# Altium footprint library CONN_HDR_1.27MM_ST_SMD.PcbLib: 118 footprints (part 6 of 8) (continued)
## HDRMINIS_M_1X28 [mm] "mini header (50mil pitch)" (continued)
3D body "BD021-02A-A1-0350-0200-0550-LB.stp": height 5.5, standoff 0, extent 5.08,-2.75 7.62,2.75
3D body "BD021-02A-A1-0350-0200-0550-LB.stp": height 5.5, standoff 0, extent 7.62,-2.75 10.16,2.75
3D body "BD021-02A-A1-0350-0200-0550-LB.stp": height 5.5, standoff 0, extent 10.16,-2.75 12.7,2.75
3D body "BD021-02A-A1-0350-0200-0550-LB.stp": height 5.5, standoff 0, extent 12.7,-2.75 15.24,2.75
3D body "BD021-02A-A1-0350-0200-0550-LB.stp": height 5.5, standoff 0, extent 15.24,-2.75 17.78,2.75

## HDRMINIS_M_1X29 [mm] "mini header (50mil pitch)"
pads (29):
  oval 0.8x3.2 smd mask+0.1: 1(-17.78,1.4) 2(-16.51,-1.4) 3(-15.24,1.4) 4(-13.97,-1.4) 5(-12.7,1.4) 6(-11.43,-1.4) 7(-10.16,1.4) 8(-8.89,-1.4) 9(-7.62,1.4) 10(-6.35,-1.4) 11(-5.08,1.4) 12(-3.81,-1.4) 13(-2.54,1.4) 14(-1.27,-1.4) 15(0,1.4) 16(1.27,-1.4) 17(2.54,1.4) 18(3.81,-1.4) 19(5.08,1.4) 20(6.35,-1.4) 21(7.62,1.4) 22(8.89,-1.4) 23(10.16,1.4) 24(11.43,-1.4) 25(12.7,1.4) 26(13.97,-1.4) 27(15.24,1.4) 28(16.51,-1.4) 29(17.78,1.4)
Top Overlay:
  circle w0.2: c-18.923,0 r0.2
  lines w0.2: -18.316,0.8 -18.415,0.635 -18.415,-0.635 -18.316,-0.8 -17.244,-0.8 -17.145,-0.635 -17.046,-0.8 ; -17.145,0.635 -17.046,0.8 -15.974,0.8 -15.875,0.635 -15.776,0.8 ; -15.974,-0.8 -15.875,-0.635 -15.776,-0.8 -14.704,-0.8 -14.605,-0.635 -14.506,-0.8 ; -14.704,0.8 -14.605,0.635 -14.506,0.8 -13.434,0.8 -13.335,0.635 -13.236,0.8 ; -13.434,-0.8 -13.335,-0.635 -13.236,-0.8 -12.164,-0.8 -12.065,-0.635 -11.966,-0.8 ; -12.164,0.8 -12.065,0.635 -11.966,0.8 -10.894,0.8 -10.795,0.635 -10.696,0.8 ; -10.894,-0.8 -10.795,-0.635 -10.696,-0.8 -9.624,-0.8 -9.525,-0.635 -9.426,-0.8 ; -9.624,0.8 -9.525,0.635 -9.426,0.8 -8.354,0.8 -8.255,0.635 -8.156,0.8 ; -8.354,-0.8 -8.255,-0.635 -8.156,-0.8 -7.084,-0.8 -6.985,-0.635 -6.886,-0.8 ; -7.084,0.8 -6.985,0.635 -6.886,0.8 -5.814,0.8 -5.715,0.635 -5.616,0.8 ; -5.814,-0.8 -5.715,-0.635 -5.616,-0.8 -4.544,-0.8 -4.445,-0.635 -4.346,-0.8 ; -4.544,0.8 -4.445,0.635 -4.346,0.8 -3.274,0.8 -3.175,0.635 -3.076,0.8 ; -3.274,-0.8 -3.175,-0.635 -3.076,-0.8 -2.004,-0.8 -1.905,-0.635 -1.806,-0.8 ; -2.004,0.8 -1.905,0.635 -1.806,0.8 -0.734,0.8 -0.635,0.635 -0.536,0.8 ; -0.734,-0.8 -0.635,-0.635 -0.536,-0.8 0.536,-0.8 0.635,-0.635 0.734,-0.8 ; 0.536,0.8 0.635,0.635 0.734,0.8 1.806,0.8 1.905,0.635 2.004,0.8 ; 1.806,-0.8 1.905,-0.635 2.004,-0.8 3.076,-0.8 3.175,-0.635 3.274,-0.8 ; 3.076,0.8 3.175,0.635 3.274,0.8 4.346,0.8 4.445,0.635 4.544,0.8 ; 4.346,-0.8 4.445,-0.635 4.544,-0.8 5.616,-0.8 5.715,-0.635 5.814,-0.8 ; 5.616,0.8 5.715,0.635 5.814,0.8 6.886,0.8 6.985,0.635 7.084,0.8 ; 6.886,-0.8 6.985,-0.635 7.084,-0.8 8.156,-0.8 8.255,-0.635 8.354,-0.8 ; 8.156,0.8 8.255,0.635 8.354,0.8 9.426,0.8 9.525,0.635 9.624,0.8 ; 9.426,-0.8 9.525,-0.635 9.624,-0.8 10.696,-0.8 10.795,-0.635 10.894,-0.8 ; 10.696,0.8 10.795,0.635 10.894,0.8 11.966,0.8 12.065,0.635 12.164,0.8 ; 11.966,-0.8 12.065,-0.635 12.164,-0.8 13.236,-0.8 13.335,-0.635 13.434,-0.8 ; 13.236,0.8 13.335,0.635 13.434,0.8 14.506,0.8 14.605,0.635 14.704,0.8 ; 14.506,-0.8 14.605,-0.635 14.704,-0.8 15.776,-0.8 15.875,-0.635 15.974,-0.8 ; 15.776,0.8 15.875,0.635 15.974,0.8 17.046,0.8 17.145,0.635 17.244,0.8 ; 17.046,-0.8 17.145,-0.635 17.244,-0.8 18.316,-0.8 18.415,-0.635 18.415,0.635 18.316,0.8
3D body "BD021-02A-A1-0350-0200-0550-LB.stp": height 5.5, standoff 0, extent 15.875,-2.75 18.415,2.75
3D body "BD021-02A-A1-0350-0200-0550-LB.stp": height 5.5, standoff 0, extent 13.335,-2.75 15.875,2.75
3D body "BD021-02A-A1-0350-0200-0550-LB.stp": height 5.5, standoff 0, extent 10.795,-2.75 13.335,2.75
3D body "BD021-02A-A1-0350-0200-0550-LB.stp": height 5.5, standoff 0, extent 8.255,-2.75 10.795,2.75
3D body "BD021-02A-A1-0350-0200-0550-LB.stp": height 5.5, standoff 0, extent 5.715,-2.75 8.255,2.75
3D body "BD021-02A-A1-0350-0200-0550-LB.stp": height 5.5, standoff 0, extent 3.175,-2.75 5.715,2.75
3D body "BD021-02A-A1-0350-0200-0550-LB.stp": height 5.5, standoff 0, extent 0.635,-2.75 3.175,2.75
3D body "BD021-02A-A1-0350-0200-0550-LB.stp": height 5.5, standoff 0, extent -1.905,-2.75 0.635,2.75
3D body "BD021-02A-A1-0350-0200-0550-LB.stp": height 5.5, standoff 0, extent -4.445,-2.75 -1.905,2.75
3D body "BD021-02A-A1-0350-0200-0550-LB.stp": height 5.5, standoff 0, extent -6.985,-2.75 -4.445,2.75
3D body "BD021-02A-A1-0350-0200-0550-LB.stp": height 5.5, standoff 0, extent -9.525,-2.75 -6.985,2.75
3D body "BD021-02A-A1-0350-0200-0550-LB.stp": height 5.5, standoff 0, extent -12.065,-2.75 -9.525,2.75
3D body "BD021-02A-A1-0350-0200-0550-LB.stp": height 5.5, standoff 0, extent -14.605,-2.75 -12.065,2.75
3D body "BD021-03A-A1-0350-0200-0550-LB.stp": height 5.5, standoff 0, extent -18.42,-2.75 -14.61,2.75

## HDRMINIS_M_1X30 [mm] "mini header (50mil pitch)"
pads (30):
  oval 0.8x3.2 smd mask+0.1: 1(-18.415,-1.4) 2(-17.145,1.4) 3(-15.875,-1.4) 4(-14.605,1.4) 5(-13.335,-1.4) 6(-12.065,1.4) 7(-10.795,-1.4) 8(-9.525,1.4) 9(-8.255,-1.4) 10(-6.985,1.4) 11(-5.715,-1.4) 12(-4.445,1.4) 13(-3.175,-1.4) 14(-1.905,1.4) 15(-0.635,-1.4) 16(0.635,1.4) 17(1.905,-1.4) 18(3.175,1.4) 19(4.445,-1.4) 20(5.715,1.4) 21(6.985,-1.4) 22(8.255,1.4) 23(9.525,-1.4) 24(10.795,1.4) 25(12.065,-1.4) 26(13.335,1.4) 27(14.605,-1.4) 28(15.875,1.4) 29(17.145,-1.4) 30(18.415,1.4)
Top Overlay:
  drawing of 153 lines, arcs and shapes, not listed
3D body "BD021-02A-A1-0350-0200-0550-LB.stp": height 5.5, standoff 0, extent -19.05,-2.75 -16.51,2.75
3D body "BD021-02A-A1-0350-0200-0550-LB.stp": height 5.5, standoff 0, extent -16.51,-2.75 -13.97,2.75
3D body "BD021-02A-A1-0350-0200-0550-LB.stp": height 5.5, standoff 0, extent -13.97,-2.75 -11.43,2.75
3D body "BD021-02A-A1-0350-0200-0550-LB.stp": height 5.5, standoff 0, extent -11.43,-2.75 -8.89,2.75
3D body "BD021-02A-A1-0350-0200-0550-LB.stp": height 5.5, standoff 0, extent -8.89,-2.75 -6.35,2.75
3D body "BD021-02A-A1-0350-0200-0550-LB.stp": height 5.5, standoff 0, extent -6.35,-2.75 -3.81,2.75
3D body "BD021-02A-A1-0350-0200-0550-LB.stp": height 5.5, standoff 0, extent -3.81,-2.75 -1.27,2.75
3D body "BD021-02A-A1-0350-0200-0550-LB.stp": height 5.5, standoff 0, extent -1.27,-2.75 1.27,2.75
3D body "BD021-02A-A1-0350-0200-0550-LB.stp": height 5.5, standoff 0, extent 1.27,-2.75 3.81,2.75
3D body "BD021-02A-A1-0350-0200-0550-LB.stp": height 5.5, standoff 0, extent 3.81,-2.75 6.35,2.75
3D body "BD021-02A-A1-0350-0200-0550-LB.stp": height 5.5, standoff 0, extent 6.35,-2.75 8.89,2.75
3D body "BD021-02A-A1-0350-0200-0550-LB.stp": height 5.5, standoff 0, extent 8.89,-2.75 11.43,2.75
3D body "BD021-02A-A1-0350-0200-0550-LB.stp": height 5.5, standoff 0, extent 11.43,-2.75 13.97,2.75
3D body "BD021-02A-A1-0350-0200-0550-LB.stp": height 5.5, standoff 0, extent 13.97,-2.75 16.51,2.75
3D body "BD021-02A-A1-0350-0200-0550-LB.stp": height 5.5, standoff 0, extent 16.51,-2.75 19.05,2.75

## HDRMINIS_M_1X31 [mm] "mini header (50mil pitch)"
pads (31):
  oval 0.8x3.2 smd mask+0.1: 1(-19.05,1.4) 2(-17.78,-1.4) 3(-16.51,1.4) 4(-15.24,-1.4) 5(-13.97,1.4) 6(-12.7,-1.4) 7(-11.43,1.4) 8(-10.16,-1.4) 9(-8.89,1.4) 10(-7.62,-1.4) 11(-6.35,1.4) 12(-5.08,-1.4) 13(-3.81,1.4) 14(-2.54,-1.4) 15(-1.27,1.4) 16(0,-1.4) 17(1.27,1.4) 18(2.54,-1.4) 19(3.81,1.4) 20(5.08,-1.4) 21(6.35,1.4) 22(7.62,-1.4) 23(8.89,1.4) 24(10.16,-1.4) 25(11.43,1.4) 26(12.7,-1.4) 27(13.97,1.4) 28(15.24,-1.4) 29(16.51,1.4) 30(17.78,-1.4) 31(19.05,1.4)
Top Overlay:
  drawing of 157 lines, arcs and shapes, not listed
3D body "BD021-03A-A1-0350-0200-0550-LB.stp": height 5.5, standoff 0, extent -19.69,-2.75 -15.88,2.75
3D body "BD021-02A-A1-0350-0200-0550-LB.stp": height 5.5, standoff 0, extent -15.875,-2.75 -13.335,2.75
3D body "BD021-02A-A1-0350-0200-0550-LB.stp": height 5.5, standoff 0, extent -13.335,-2.75 -10.795,2.75
3D body "BD021-02A-A1-0350-0200-0550-LB.stp": height 5.5, standoff 0, extent -10.795,-2.75 -8.255,2.75
3D body "BD021-02A-A1-0350-0200-0550-LB.stp": height 5.5, standoff 0, extent -8.255,-2.75 -5.715,2.75
3D body "BD021-02A-A1-0350-0200-0550-LB.stp": height 5.5, standoff 0, extent -5.715,-2.75 -3.175,2.75
3D body "BD021-02A-A1-0350-0200-0550-LB.stp": height 5.5, standoff 0, extent -3.175,-2.75 -0.635,2.75
3D body "BD021-02A-A1-0350-0200-0550-LB.stp": height 5.5, standoff 0, extent -0.635,-2.75 1.905,2.75
3D body "BD021-02A-A1-0350-0200-0550-LB.stp": height 5.5, standoff 0, extent 1.905,-2.75 4.445,2.75
3D body "BD021-02A-A1-0350-0200-0550-LB.stp": height 5.5, standoff 0, extent 4.445,-2.75 6.985,2.75
3D body "BD021-02A-A1-0350-0200-0550-LB.stp": height 5.5, standoff 0, extent 6.985,-2.75 9.525,2.75
3D body "BD021-02A-A1-0350-0200-0550-LB.stp": height 5.5, standoff 0, extent 9.525,-2.75 12.065,2.75
3D body "BD021-02A-A1-0350-0200-0550-LB.stp": height 5.5, standoff 0, extent 12.065,-2.75 14.605,2.75
3D body "BD021-02A-A1-0350-0200-0550-LB.stp": height 5.5, standoff 0, extent 14.605,-2.75 17.145,2.75
3D body "BD021-02A-A1-0350-0200-0550-LB.stp": height 5.5, standoff 0, extent 17.145,-2.75 19.685,2.75

## HDRMINIS_M_1X32 [mm] "mini header (50mil pitch)"
pads (32):
  oval 0.8x3.2 smd mask+0.1: 1(-19.685,-1.4) 2(-18.415,1.4) 3(-17.145,-1.4) 4(-15.875,1.4) 5(-14.605,-1.4) 6(-13.335,1.4) 7(-12.065,-1.4) 8(-10.795,1.4) 9(-9.525,-1.4) 10(-8.255,1.4) 11(-6.985,-1.4) 12(-5.715,1.4) 13(-4.445,-1.4) 14(-3.175,1.4) 15(-1.905,-1.4) 16(-0.635,1.4) 17(0.635,-1.4) 18(1.905,1.4) 19(3.175,-1.4) 20(4.445,1.4) 21(5.715,-1.4) 22(6.985,1.4) 23(8.255,-1.4) 24(9.525,1.4) 25(10.795,-1.4) 26(12.065,1.4) 27(13.335,-1.4) 28(14.605,1.4) 29(15.875,-1.4) 30(17.145,1.4) 31(18.415,-1.4) 32(19.685,1.4)
Top Overlay:
  drawing of 163 lines, arcs and shapes, not listed
3D body "BD021-02A-A1-0350-0200-0550-LB.stp": height 5.5, standoff 0, extent -20.32,-2.75 -17.78,2.75
3D body "BD021-02A-A1-0350-0200-0550-LB.stp": height 5.5, standoff 0, extent -17.78,-2.75 -15.24,2.75
3D body "BD021-02A-A1-0350-0200-0550-LB.stp": height 5.5, standoff 0, extent -15.24,-2.75 -12.7,2.75
3D body "BD021-02A-A1-0350-0200-0550-LB.stp": height 5.5, standoff 0, extent -12.7,-2.75 -10.16,2.75
3D body "BD021-02A-A1-0350-0200-0550-LB.stp": height 5.5, standoff 0, extent -10.16,-2.75 -7.62,2.75
3D body "BD021-02A-A1-0350-0200-0550-LB.stp": height 5.5, standoff 0, extent -7.62,-2.75 -5.08,2.75
3D body "BD021-02A-A1-0350-0200-0550-LB.stp": height 5.5, standoff 0, extent -5.08,-2.75 -2.54,2.75
3D body "BD021-02A-A1-0350-0200-0550-LB.stp": height 5.5, standoff 0, extent -2.54,-2.75 0,2.75
3D body "BD021-02A-A1-0350-0200-0550-LB.stp": height 5.5, standoff 0, extent 0,-2.75 2.54,2.75
3D body "BD021-02A-A1-0350-0200-0550-LB.stp": height 5.5, standoff 0, extent 2.54,-2.75 5.08,2.75
3D body "BD021-02A-A1-0350-0200-0550-LB.stp": height 5.5, standoff 0, extent 5.08,-2.75 7.62,2.75
3D body "BD021-02A-A1-0350-0200-0550-LB.stp": height 5.5, standoff 0, extent 7.62,-2.75 10.16,2.75
3D body "BD021-02A-A1-0350-0200-0550-LB.stp": height 5.5, standoff 0, extent 10.16,-2.75 12.7,2.75
3D body "BD021-02A-A1-0350-0200-0550-LB.stp": height 5.5, standoff 0, extent 12.7,-2.75 15.24,2.75
3D body "BD021-02A-A1-0350-0200-0550-LB.stp": height 5.5, standoff 0, extent 15.24,-2.75 17.78,2.75
3D body "BD021-02A-A1-0350-0200-0550-LB.stp": height 5.5, standoff 0, extent 17.78,-2.75 20.32,2.75

## HDRMINIS_M_1X33 [mm] "mini header (50mil pitch)"
pads (33):
  oval 0.8x3.2 smd mask+0.1: 1(-20.32,1.4) 2(-19.05,-1.4) 3(-17.78,1.4) 4(-16.51,-1.4) 5(-15.24,1.4) 6(-13.97,-1.4) 7(-12.7,1.4) 8(-11.43,-1.4) 9(-10.16,1.4) 10(-8.89,-1.4) 11(-7.62,1.4) 12(-6.35,-1.4) 13(-5.08,1.4) 14(-3.81,-1.4) 15(-2.54,1.4) 16(-1.27,-1.4) 17(0,1.4) 18(1.27,-1.4) 19(2.54,1.4) 20(3.81,-1.4) 21(5.08,1.4) 22(6.35,-1.4) 23(7.62,1.4) 24(8.89,-1.4) 25(10.16,1.4) 26(11.43,-1.4) 27(12.7,1.4) 28(13.97,-1.4) 29(15.24,1.4) 30(16.51,-1.4) 31(17.78,1.4) 32(19.05,-1.4) 33(20.32,1.4)
Top Overlay:
  drawing of 167 lines, arcs and shapes, not listed
3D body "BD021-03A-A1-0350-0200-0550-LB.stp": height 5.5, standoff 0, extent -20.96,-2.75 -17.15,2.75
3D body "BD021-02A-A1-0350-0200-0550-LB.stp": height 5.5, standoff 0, extent -17.145,-2.75 -14.605,2.75
3D body "BD021-02A-A1-0350-0200-0550-LB.stp": height 5.5, standoff 0, extent -14.605,-2.75 -12.065,2.75
3D body "BD021-02A-A1-0350-0200-0550-LB.stp": height 5.5, standoff 0, extent -12.065,-2.75 -9.525,2.75
3D body "BD021-02A-A1-0350-0200-0550-LB.stp": height 5.5, standoff 0, extent -9.525,-2.75 -6.985,2.75
3D body "BD021-02A-A1-0350-0200-0550-LB.stp": height 5.5, standoff 0, extent -6.985,-2.75 -4.445,2.75
3D body "BD021-02A-A1-0350-0200-0550-LB.stp": height 5.5, standoff 0, extent -4.445,-2.75 -1.905,2.75
3D body "BD021-02A-A1-0350-0200-0550-LB.stp": height 5.5, standoff 0, extent -1.905,-2.75 0.635,2.75
3D body "BD021-02A-A1-0350-0200-0550-LB.stp": height 5.5, standoff 0, extent 0.635,-2.75 3.175,2.75
3D body "BD021-02A-A1-0350-0200-0550-LB.stp": height 5.5, standoff 0, extent 3.175,-2.75 5.715,2.75
3D body "BD021-02A-A1-0350-0200-0550-LB.stp": height 5.5, standoff 0, extent 5.715,-2.75 8.255,2.75
3D body "BD021-02A-A1-0350-0200-0550-LB.stp": height 5.5, standoff 0, extent 8.255,-2.75 10.795,2.75
3D body "BD021-02A-A1-0350-0200-0550-LB.stp": height 5.5, standoff 0, extent 10.795,-2.75 13.335,2.75
3D body "BD021-02A-A1-0350-0200-0550-LB.stp": height 5.5, standoff 0, extent 13.335,-2.75 15.875,2.75
3D body "BD021-02A-A1-0350-0200-0550-LB.stp": height 5.5, standoff 0, extent 15.875,-2.75 18.415,2.75
3D body "BD021-02A-A1-0350-0200-0550-LB.stp": height 5.5, standoff 0, extent 18.415,-2.75 20.955,2.75

## HDRMINIS_M_1X34 [mm] "mini header (50mil pitch)"
pads (34):
  oval 0.8x3.2 smd mask+0.1: 1(-20.955,-1.4) 2(-19.685,1.4) 3(-18.415,-1.4) 4(-17.145,1.4) 5(-15.875,-1.4) 6(-14.605,1.4) 7(-13.335,-1.4) 8(-12.065,1.4) 9(-10.795,-1.4) 10(-9.525,1.4) 11(-8.255,-1.4) 12(-6.985,1.4) 13(-5.715,-1.4) 14(-4.445,1.4) 15(-3.175,-1.4) 16(-1.905,1.4) 17(-0.635,-1.4) 18(0.635,1.4) 19(1.905,-1.4) 20(3.175,1.4) 21(4.445,-1.4) 22(5.715,1.4) 23(6.985,-1.4) 24(8.255,1.4) 25(9.525,-1.4) 26(10.795,1.4) 27(12.065,-1.4) 28(13.335,1.4) 29(14.605,-1.4) 30(15.875,1.4) 31(17.145,-1.4) 32(18.415,1.4) 33(19.685,-1.4) 34(20.955,1.4)
Top Overlay:
  drawing of 173 lines, arcs and shapes, not listed
3D body "BD021-02A-A1-0350-0200-0550-LB.stp": height 5.5, standoff 0, extent 19.05,-2.75 21.59,2.75
3D body "BD021-02A-A1-0350-0200-0550-LB.stp": height 5.5, standoff 0, extent 16.51,-2.75 19.05,2.75
3D body "BD021-02A-A1-0350-0200-0550-LB.stp": height 5.5, standoff 0, extent 13.97,-2.75 16.51,2.75
3D body "BD021-02A-A1-0350-0200-0550-LB.stp": height 5.5, standoff 0, extent 11.43,-2.75 13.97,2.75
3D body "BD021-02A-A1-0350-0200-0550-LB.stp": height 5.5, standoff 0, extent 8.89,-2.75 11.43,2.75
3D body "BD021-02A-A1-0350-0200-0550-LB.stp": height 5.5, standoff 0, extent 6.35,-2.75 8.89,2.75
3D body "BD021-02A-A1-0350-0200-0550-LB.stp": height 5.5, standoff 0, extent 3.81,-2.75 6.35,2.75
3D body "BD021-02A-A1-0350-0200-0550-LB.stp": height 5.5, standoff 0, extent 1.27,-2.75 3.81,2.75
3D body "BD021-02A-A1-0350-0200-0550-LB.stp": height 5.5, standoff 0, extent -1.27,-2.75 1.27,2.75
3D body "BD021-02A-A1-0350-0200-0550-LB.stp": height 5.5, standoff 0, extent -3.81,-2.75 -1.27,2.75
3D body "BD021-02A-A1-0350-0200-0550-LB.stp": height 5.5, standoff 0, extent -6.35,-2.75 -3.81,2.75
3D body "BD021-02A-A1-0350-0200-0550-LB.stp": height 5.5, standoff 0, extent -8.89,-2.75 -6.35,2.75
3D body "BD021-02A-A1-0350-0200-0550-LB.stp": height 5.5, standoff 0, extent -11.43,-2.75 -8.89,2.75
3D body "BD021-02A-A1-0350-0200-0550-LB.stp": height 5.5, standoff 0, extent -13.97,-2.75 -11.43,2.75
3D body "BD021-02A-A1-0350-0200-0550-LB.stp": height 5.5, standoff 0, extent -16.51,-2.75 -13.97,2.75
3D body "BD021-02A-A1-0350-0200-0550-LB.stp": height 5.5, standoff 0, extent -19.05,-2.75 -16.51,2.75
3D body "BD021-02A-A1-0350-0200-0550-LB.stp": height 5.5, standoff 0, extent -21.59,-2.75 -19.05,2.75

## HDRMINIS_M_1X35 [mm] "mini header (50mil pitch)"
pads (35):
  oval 0.8x3.2 smd mask+0.1: 1(-21.59,1.4) 2(-20.32,-1.4) 3(-19.05,1.4) 4(-17.78,-1.4) 5(-16.51,1.4) 6(-15.24,-1.4) 7(-13.97,1.4) 8(-12.7,-1.4) 9(-11.43,1.4) 10(-10.16,-1.4) 11(-8.89,1.4) 12(-7.62,-1.4) 13(-6.35,1.4) 14(-5.08,-1.4) 15(-3.81,1.4) 16(-2.54,-1.4) 17(-1.27,1.4) 18(0,-1.4) 19(1.27,1.4) 20(2.54,-1.4) 21(3.81,1.4) 22(5.08,-1.4) 23(6.35,1.4) 24(7.62,-1.4) 25(8.89,1.4) 26(10.16,-1.4) 27(11.43,1.4) 28(12.7,-1.4) 29(13.97,1.4) 30(15.24,-1.4) 31(16.51,1.4) 32(17.78,-1.4) 33(19.05,1.4) 34(20.32,-1.4) 35(21.59,1.4)
Top Overlay:
  drawing of 177 lines, arcs and shapes, not listed
3D body "BD021-02A-A1-0350-0200-0550-LB.stp": height 5.5, standoff 0, extent 19.685,-2.75 22.225,2.75
3D body "BD021-02A-A1-0350-0200-0550-LB.stp": height 5.5, standoff 0, extent 17.145,-2.75 19.685,2.75
3D body "BD021-02A-A1-0350-0200-0550-LB.stp": height 5.5, standoff 0, extent 14.605,-2.75 17.145,2.75
3D body "BD021-02A-A1-0350-0200-0550-LB.stp": height 5.5, standoff 0, extent 12.065,-2.75 14.605,2.75
3D body "BD021-02A-A1-0350-0200-0550-LB.stp": height 5.5, standoff 0, extent 9.525,-2.75 12.065,2.75
3D body "BD021-02A-A1-0350-0200-0550-LB.stp": height 5.5, standoff 0, extent 6.985,-2.75 9.525,2.75
3D body "BD021-02A-A1-0350-0200-0550-LB.stp": height 5.5, standoff 0, extent 4.445,-2.75 6.985,2.75
3D body "BD021-02A-A1-0350-0200-0550-LB.stp": height 5.5, standoff 0, extent 1.905,-2.75 4.445,2.75
3D body "BD021-02A-A1-0350-0200-0550-LB.stp": height 5.5, standoff 0, extent -0.635,-2.75 1.905,2.75
3D body "BD021-02A-A1-0350-0200-0550-LB.stp": height 5.5, standoff 0, extent -3.175,-2.75 -0.635,2.75
3D body "BD021-02A-A1-0350-0200-0550-LB.stp": height 5.5, standoff 0, extent -5.715,-2.75 -3.175,2.75
3D body "BD021-02A-A1-0350-0200-0550-LB.stp": height 5.5, standoff 0, extent -8.255,-2.75 -5.715,2.75
3D body "BD021-02A-A1-0350-0200-0550-LB.stp": height 5.5, standoff 0, extent -10.795,-2.75 -8.255,2.75
3D body "BD021-02A-A1-0350-0200-0550-LB.stp": height 5.5, standoff 0, extent -13.335,-2.75 -10.795,2.75
3D body "BD021-02A-A1-0350-0200-0550-LB.stp": height 5.5, standoff 0, extent -15.875,-2.75 -13.335,2.75
3D body "BD021-02A-A1-0350-0200-0550-LB.stp": height 5.5, standoff 0, extent -18.415,-2.75 -15.875,2.75
3D body "BD021-03A-A1-0350-0200-0550-LB.stp": height 5.5, standoff 0, extent -22.23,-2.75 -18.42,2.75

## HDRMINIS_M_1X36 [mm] "mini header (50mil pitch)"
pads (36):
  oval 0.8x3.2 smd mask+0.1: 1(-22.225,-1.4) 2(-20.955,1.4) 3(-19.685,-1.4) 4(-18.415,1.4) 5(-17.145,-1.4) 6(-15.875,1.4) 7(-14.605,-1.4) 8(-13.335,1.4) 9(-12.065,-1.4) 10(-10.795,1.4) 11(-9.525,-1.4) 12(-8.255,1.4) 13(-6.985,-1.4) 14(-5.715,1.4) 15(-4.445,-1.4) 16(-3.175,1.4) 17(-1.905,-1.4) 18(-0.635,1.4) 19(0.635,-1.4) 20(1.905,1.4) 21(3.175,-1.4) 22(4.445,1.4) 23(5.715,-1.4) 24(6.985,1.4) 25(8.255,-1.4) 26(9.525,1.4) 27(10.795,-1.4) 28(12.065,1.4) 29(13.335,-1.4) 30(14.605,1.4) 31(15.875,-1.4) 32(17.145,1.4) 33(18.415,-1.4) 34(19.685,1.4) 35(20.955,-1.4) 36(22.225,1.4)
Top Overlay:
  drawing of 183 lines, arcs and shapes, not listed
3D body "BD021-02A-A1-0350-0200-0550-LB.stp": height 5.5, standoff 0, extent -22.86,-2.75 -20.32,2.75
3D body "BD021-02A-A1-0350-0200-0550-LB.stp": height 5.5, standoff 0, extent -20.32,-2.75 -17.78,2.75
3D body "BD021-02A-A1-0350-0200-0550-LB.stp": height 5.5, standoff 0, extent -17.78,-2.75 -15.24,2.75
3D body "BD021-02A-A1-0350-0200-0550-LB.stp": height 5.5, standoff 0, extent -15.24,-2.75 -12.7,2.75
3D body "BD021-02A-A1-0350-0200-0550-LB.stp": height 5.5, standoff 0, extent -12.7,-2.75 -10.16,2.75
3D body "BD021-02A-A1-0350-0200-0550-LB.stp": height 5.5, standoff 0, extent -10.16,-2.75 -7.62,2.75
3D body "BD021-02A-A1-0350-0200-0550-LB.stp": height 5.5, standoff 0, extent -7.62,-2.75 -5.08,2.75
3D body "BD021-02A-A1-0350-0200-0550-LB.stp": height 5.5, standoff 0, extent -5.08,-2.75 -2.54,2.75
3D body "BD021-02A-A1-0350-0200-0550-LB.stp": height 5.5, standoff 0, extent -2.54,-2.75 0,2.75
3D body "BD021-02A-A1-0350-0200-0550-LB.stp": height 5.5, standoff 0, extent 0,-2.75 2.54,2.75
3D body "BD021-02A-A1-0350-0200-0550-LB.stp": height 5.5, standoff 0, extent 2.54,-2.75 5.08,2.75
3D body "BD021-02A-A1-0350-0200-0550-LB.stp": height 5.5, standoff 0, extent 5.08,-2.75 7.62,2.75
3D body "BD021-02A-A1-0350-0200-0550-LB.stp": height 5.5, standoff 0, extent 7.62,-2.75 10.16,2.75
3D body "BD021-02A-A1-0350-0200-0550-LB.stp": height 5.5, standoff 0, extent 10.16,-2.75 12.7,2.75
3D body "BD021-02A-A1-0350-0200-0550-LB.stp": height 5.5, standoff 0, extent 12.7,-2.75 15.24,2.75
3D body "BD021-02A-A1-0350-0200-0550-LB.stp": height 5.5, standoff 0, extent 15.24,-2.75 17.78,2.75
3D body "BD021-02A-A1-0350-0200-0550-LB.stp": height 5.5, standoff 0, extent 17.78,-2.75 20.32,2.75
3D body "BD021-02A-A1-0350-0200-0550-LB.stp": height 5.5, standoff 0, extent 20.32,-2.75 22.86,2.75

## HDRMINIS_M_1X37 [mm] "mini header (50mil pitch)"
pads (37):
  oval 0.8x3.2 smd mask+0.1: 1(-22.86,1.4) 2(-21.59,-1.4) 3(-20.32,1.4) 4(-19.05,-1.4) 5(-17.78,1.4) 6(-16.51,-1.4) 7(-15.24,1.4) 8(-13.97,-1.4) 9(-12.7,1.4) 10(-11.43,-1.4) 11(-10.16,1.4) 12(-8.89,-1.4) 13(-7.62,1.4) 14(-6.35,-1.4) 15(-5.08,1.4) 16(-3.81,-1.4) 17(-2.54,1.4) 18(-1.27,-1.4) 19(0,1.4) 20(1.27,-1.4) 21(2.54,1.4) 22(3.81,-1.4) 23(5.08,1.4) 24(6.35,-1.4) 25(7.62,1.4) 26(8.89,-1.4) 27(10.16,1.4) 28(11.43,-1.4) 29(12.7,1.4) 30(13.97,-1.4) 31(15.24,1.4) 32(16.51,-1.4) 33(17.78,1.4) 34(19.05,-1.4) 35(20.32,1.4) 36(21.59,-1.4) 37(22.86,1.4)
Top Overlay:
  drawing of 187 lines, arcs and shapes, not listed
3D body "BD021-02A-A1-0350-0200-0550-LB.stp": height 5.5, standoff 0, extent 20.955,-2.75 23.495,2.75
3D body "BD021-02A-A1-0350-0200-0550-LB.stp": height 5.5, standoff 0, extent 18.415,-2.75 20.955,2.75
3D body "BD021-02A-A1-0350-0200-0550-LB.stp": height 5.5, standoff 0, extent 15.875,-2.75 18.415,2.75
3D body "BD021-02A-A1-0350-0200-0550-LB.stp": height 5.5, standoff 0, extent 13.335,-2.75 15.875,2.75
3D body "BD021-02A-A1-0350-0200-0550-LB.stp": height 5.5, standoff 0, extent 10.795,-2.75 13.335,2.75
3D body "BD021-02A-A1-0350-0200-0550-LB.stp": height 5.5, standoff 0, extent 8.255,-2.75 10.795,2.75
3D body "BD021-02A-A1-0350-0200-0550-LB.stp": height 5.5, standoff 0, extent 5.715,-2.75 8.255,2.75
3D body "BD021-02A-A1-0350-0200-0550-LB.stp": height 5.5, standoff 0, extent 3.175,-2.75 5.715,2.75
3D body "BD021-02A-A1-0350-0200-0550-LB.stp": height 5.5, standoff 0, extent 0.635,-2.75 3.175,2.75
3D body "BD021-02A-A1-0350-0200-0550-LB.stp": height 5.5, standoff 0, extent -1.905,-2.75 0.635,2.75
3D body "BD021-02A-A1-0350-0200-0550-LB.stp": height 5.5, standoff 0, extent -4.445,-2.75 -1.905,2.75
3D body "BD021-02A-A1-0350-0200-0550-LB.stp": height 5.5, standoff 0, extent -6.985,-2.75 -4.445,2.75
3D body "BD021-02A-A1-0350-0200-0550-LB.stp": height 5.5, standoff 0, extent -9.525,-2.75 -6.985,2.75
3D body "BD021-02A-A1-0350-0200-0550-LB.stp": height 5.5, standoff 0, extent -12.065,-2.75 -9.525,2.75
3D body "BD021-02A-A1-0350-0200-0550-LB.stp": height 5.5, standoff 0, extent -14.605,-2.75 -12.065,2.75
3D body "BD021-02A-A1-0350-0200-0550-LB.stp": height 5.5, standoff 0, extent -17.145,-2.75 -14.605,2.75
3D body "BD021-02A-A1-0350-0200-0550-LB.stp": height 5.5, standoff 0, extent -19.685,-2.75 -17.145,2.75
3D body "BD021-03A-A1-0350-0200-0550-LB.stp": height 5.5, standoff 0, extent -23.5,-2.75 -19.69,2.75

## HDRMINIS_M_1X38 [mm] "mini header (50mil pitch)"
pads (38):
  oval 0.8x3.2 smd mask+0.1: 1(-23.495,-1.4) 2(-22.225,1.4) 3(-20.955,-1.4) 4(-19.685,1.4) 5(-18.415,-1.4) 6(-17.145,1.4) 7(-15.875,-1.4) 8(-14.605,1.4) 9(-13.335,-1.4) 10(-12.065,1.4) 11(-10.795,-1.4) 12(-9.525,1.4) 13(-8.255,-1.4) 14(-6.985,1.4) 15(-5.715,-1.4) 16(-4.445,1.4) 17(-3.175,-1.4) 18(-1.905,1.4) 19(-0.635,-1.4) 20(0.635,1.4) 21(1.905,-1.4) 22(3.175,1.4) 23(4.445,-1.4) 24(5.715,1.4) 25(6.985,-1.4) 26(8.255,1.4) 27(9.525,-1.4) 28(10.795,1.4) 29(12.065,-1.4) 30(13.335,1.4) 31(14.605,-1.4) 32(15.875,1.4) 33(17.145,-1.4) 34(18.415,1.4) 35(19.685,-1.4) 36(20.955,1.4) 37(22.225,-1.4) 38(23.495,1.4)
Top Overlay:
  drawing of 193 lines, arcs and shapes, not listed
3D body "BD021-02A-A1-0350-0200-0550-LB.stp": height 5.5, standoff 0, extent -24.13,-2.75 -21.59,2.75
3D body "BD021-02A-A1-0350-0200-0550-LB.stp": height 5.5, standoff 0, extent -21.59,-2.75 -19.05,2.75
3D body "BD021-02A-A1-0350-0200-0550-LB.stp": height 5.5, standoff 0, extent -19.05,-2.75 -16.51,2.75
3D body "BD021-02A-A1-0350-0200-0550-LB.stp": height 5.5, standoff 0, extent -16.51,-2.75 -13.97,2.75
3D body "BD021-02A-A1-0350-0200-0550-LB.stp": height 5.5, standoff 0, extent -13.97,-2.75 -11.43,2.75
3D body "BD021-02A-A1-0350-0200-0550-LB.stp": height 5.5, standoff 0, extent -11.43,-2.75 -8.89,2.75
3D body "BD021-02A-A1-0350-0200-0550-LB.stp": height 5.5, standoff 0, extent -8.89,-2.75 -6.35,2.75
3D body "BD021-02A-A1-0350-0200-0550-LB.stp": height 5.5, standoff 0, extent -6.35,-2.75 -3.81,2.75
3D body "BD021-02A-A1-0350-0200-0550-LB.stp": height 5.5, standoff 0, extent -3.81,-2.75 -1.27,2.75
3D body "BD021-02A-A1-0350-0200-0550-LB.stp": height 5.5, standoff 0, extent -1.27,-2.75 1.27,2.75
3D body "BD021-02A-A1-0350-0200-0550-LB.stp": height 5.5, standoff 0, extent 1.27,-2.75 3.81,2.75
3D body "BD021-02A-A1-0350-0200-0550-LB.stp": height 5.5, standoff 0, extent 3.81,-2.75 6.35,2.75
3D body "BD021-02A-A1-0350-0200-0550-LB.stp": height 5.5, standoff 0, extent 6.35,-2.75 8.89,2.75
3D body "BD021-02A-A1-0350-0200-0550-LB.stp": height 5.5, standoff 0, extent 8.89,-2.75 11.43,2.75
3D body "BD021-02A-A1-0350-0200-0550-LB.stp": height 5.5, standoff 0, extent 11.43,-2.75 13.97,2.75
3D body "BD021-02A-A1-0350-0200-0550-LB.stp": height 5.5, standoff 0, extent 13.97,-2.75 16.51,2.75
3D body "BD021-02A-A1-0350-0200-0550-LB.stp": height 5.5, standoff 0, extent 16.51,-2.75 19.05,2.75
3D body "BD021-02A-A1-0350-0200-0550-LB.stp": height 5.5, standoff 0, extent 19.05,-2.75 21.59,2.75
3D body "BD021-02A-A1-0350-0200-0550-LB.stp": height 5.5, standoff 0, extent 21.59,-2.75 24.13,2.75